# Altium footprint library Hydrolib_pcb.PcbLib: 101 footprints (part 1 of 7)
Each footprint in its own frame and in the unit in brackets; x right, y up, seen from the top. Pads: shape width x height; smd on the part's side, far side on the other; paste and mask are expansions set on the pad; w line width, h text height; cw(c..) or ccw(c..) is an arc to the next point about the centre after c.
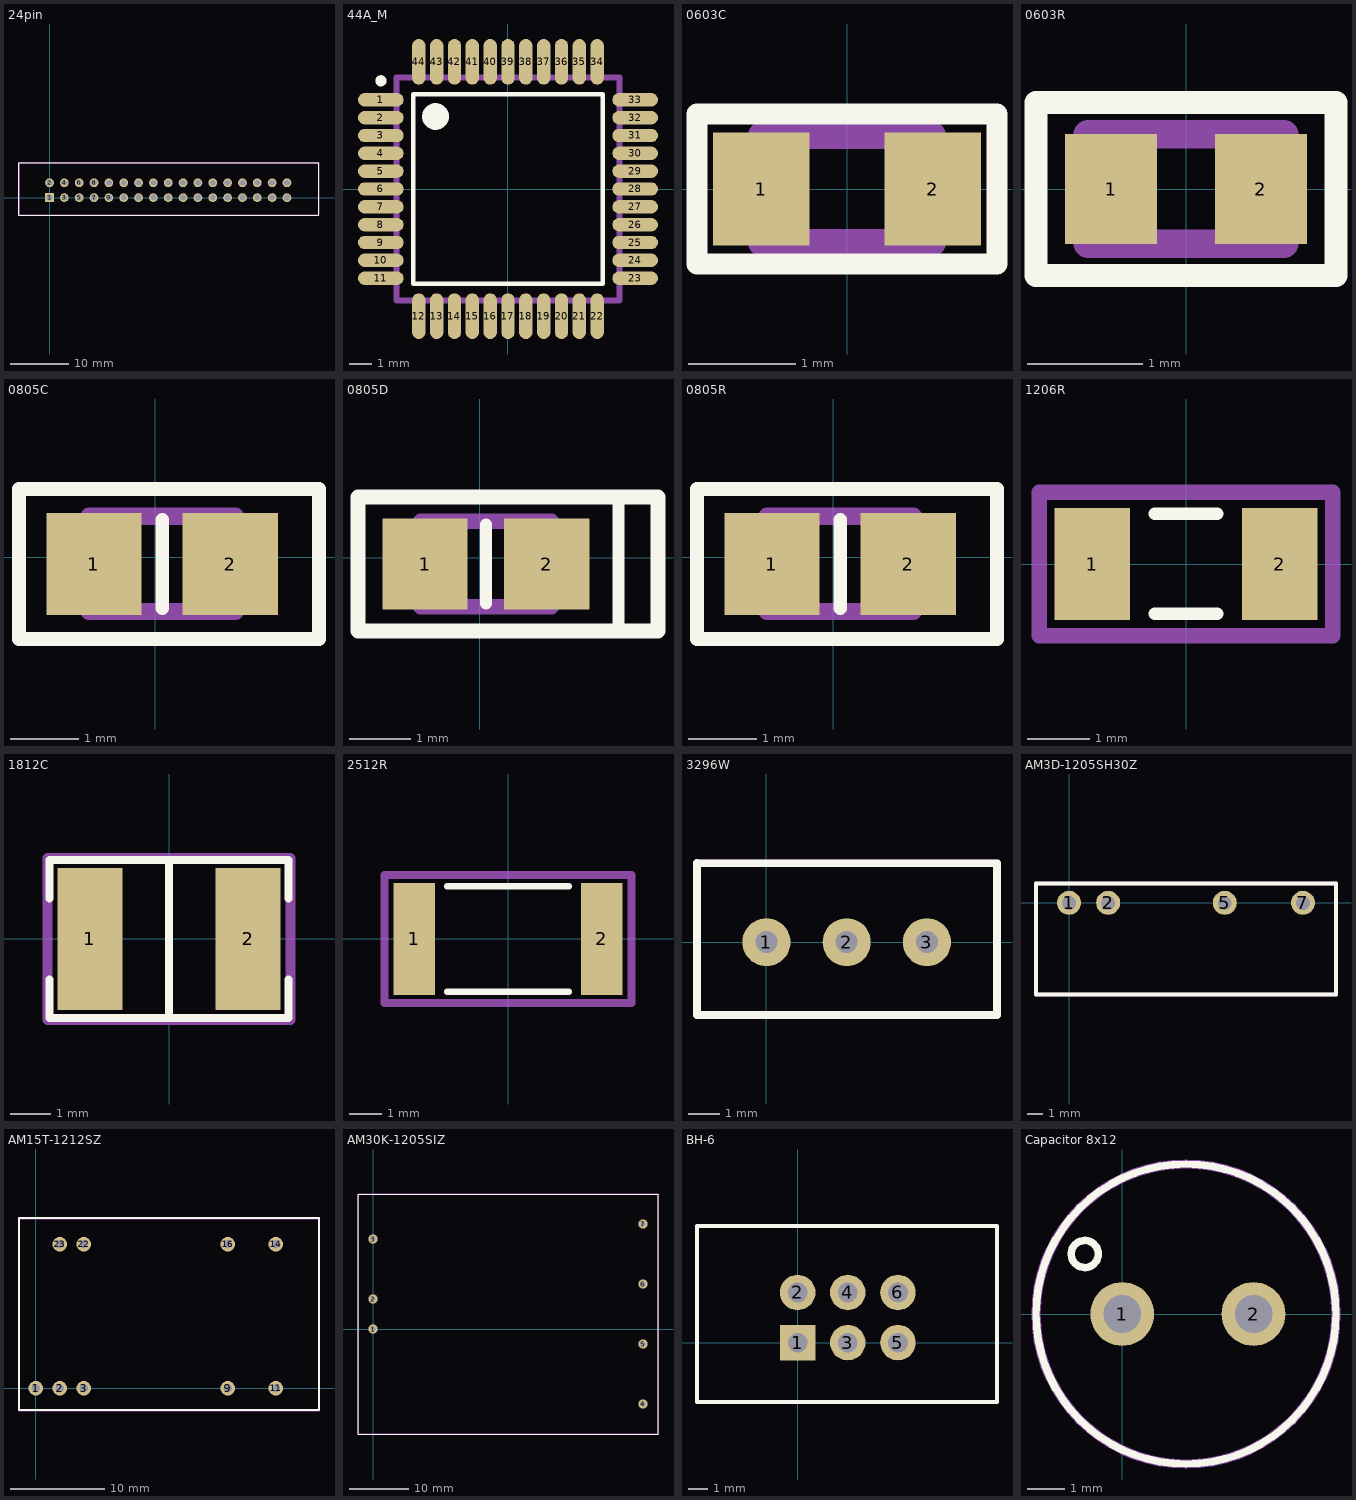
[diagram p0: the footprints below, top view; thin cyan lines are the x and y axes]

## 24pin [mm]
pads (34):
  rect 1.5x1.5 hole 1: 1(0,0)
  round 1.5 hole 1: 2(0,2.54) 3(2.54,0) 4(2.54,2.54) 5(5.08,0) 6(5.08,2.54) 7(7.62,0) 8(7.62,2.54) 9(10.16,0) 10(10.16,2.54) 11(12.7,0) 12(12.7,2.54) 13(15.24,0) 14(15.24,2.54) 15(17.78,0) 16(17.78,2.54) 17(20.32,0) 18(20.32,2.54) 19(22.86,0) 20(22.86,2.54) 21(25.4,0) 22(25.4,2.54) 23(27.94,0) 24(27.94,2.54) 25(30.48,0) 26(30.48,2.54) 27(33.02,0) 28(33.02,2.54) 29(35.56,0) 30(35.56,2.54) 31(38.1,0) 32(38.1,2.54) 33(40.64,0) 34(40.64,2.54)
Top Overlay:
  lines w0.2: -5.201,6 -5.224,5.977 -5.224,-3.017 46.076,-3.017 46.11,-2.982 46.11,6 46.109,6.001 -5.2,6.001
Bottom Overlay:
  lines w0.2: -5.214,-2.989 -5.2,-2.975 ; -5.2,6 -5.2,6.001 46.052,6.001 46.126,5.926 46.126,-3.004 -5.171,-3.004
  lines w0.254: -5.2,-2.975 -5.2,6.001
Pattern top:
  lines w0.25: -5.224,6 -5.224,-3.017 46.076,-3.017 ; -5.108,6.001 46.05,6.001 ; 46.11,-3.047 46.11,6
  lines w0.254: -5.2,-3 -5.2,-0.5
  text ".Designator" at 15.1,3.2 h2.15
3D body "BH-34.STEP": height 9, standoff -3.1, extent -5.044,-3.154 45.736,5.846

## 44A_M [mm] "Thin QFP, 44-Leads, Body 10x10mm, Pitch 0.8mm, IPC Low Density"
height 1.2
pads (44):
  oval 2.05x0.6 smd: 1(-5.7,4) 2(-5.7,3.2) 3(-5.7,2.4) 4(-5.7,1.6) 5(-5.7,0.8) 6(-5.7,0) 7(-5.7,-0.8) 8(-5.7,-1.6) 9(-5.7,-2.4) 10(-5.7,-3.2) 11(-5.7,-4) 23(5.7,-4) 24(5.7,-3.2) 25(5.7,-2.4) 26(5.7,-1.6) 27(5.7,-0.8) 28(5.7,0) 29(5.7,0.8) 30(5.7,1.6) 31(5.7,2.4) 32(5.7,3.2) 33(5.7,4)
  oval 0.6x2.05 smd: 12(-4,-5.7) 13(-3.2,-5.7) 14(-2.4,-5.7) 15(-1.6,-5.7) 16(-0.8,-5.7) 17(0,-5.7) 18(0.8,-5.7) 19(1.6,-5.7) 20(2.4,-5.7) 21(3.2,-5.7) 22(4,-5.7) 34(4,5.7) 35(3.2,5.7) 36(2.4,5.7) 37(1.6,5.7) 38(0.8,5.7) 39(0,5.7) 40(-0.8,5.7) 41(-1.6,5.7) 42(-2.4,5.7) 43(-3.2,5.7) 44(-4,5.7)
Top Overlay:
  circle w0.6: c-3.25,3.25 r0.3
  circle w0.25: c-5.7,4.85 r0.125
  lines w0.2: -4.25,-4.25 4.25,-4.25 4.25,4.25 -4.25,4.25 -4.25,-4.25
Pattern top:
  lines w0.25: -5,-5 5,-5 5,5 -5,5 -5,-5
  text ".Designator" at -4,0 h2.15
3D body: height 1.2, standoff 0, extent -5,-5 5,5

## 0603C [mm] "Chip Resistor, 2-Leads, Body 1,40x0,80mm, IPC Medium Density"
height 0.9
pads (2):
  rect 0.9x1.05 smd: 1(-0.8,0) 2(0.8,0)
Top Overlay:
  lines w0.2: -1.4,-0.7 1.4,-0.7 1.4,0.7 -1.4,0.7 -1.4,-0.7
Pattern top:
  lines w0.25: -0.8,-0.5 0.8,-0.5 0.8,0.5 -0.8,0.5 -0.8,-0.5
  text ".Designator" at -2.2,1.4 h2.15
3D body "CAPC-0603-T0.9-BN.stp": height 0.9, standoff 0, extent -0.85,-0.45 0.85,0.45

## 0603R [mm] "Chip Resistor, 2-Leads, Body 1.60x0.85mm, IPC Medium Density"
height 0.5
pads (2):
  rect 0.8x0.95 smd: 1(-0.65,0) 2(0.65,0)
Top Overlay:
  lines w0.2: -1.3,-0.75 1.3,-0.75 1.3,0.75 -1.3,0.75 -1.3,-0.75
Pattern top:
  lines w0.25: -0.85,-0.475 0.85,-0.475 0.85,0.475 -0.85,0.475 -0.85,-0.475
  text ".Designator" at -2.4,1.4 h2.15
3D body "NTC-0603-T0.9.stp": height 0.9, standoff 0, extent -0.875,-0.475 0.875,0.475

## 0805C [mm]
pads (2):
  rect 1.4x1.5 smd: 1(-0.9,-0.1) 2(1.1,-0.1)
Top Overlay:
  lines w0.2: 0.1,-0.75 0.1,0.55 ; -2,-1.2 -2,1 2.4,1 2.4,-1.2 -2,-1.2
Pattern top:
  lines w0.25: -0.975,-0.8 1.175,-0.8 1.175,0.6 -0.975,0.6 -0.975,-0.8
  text ".Designator" at -3.4,1.6 h2.15
3D body "CAPC-0805-T1.35-BN.stp": height 0.67, standoff -0.67, extent -0.95,-0.8 1.15,0.55

## 0805D [mm]
pads (2):
  rect 1.4x1.5 smd: 1(-0.9,-0.1) 2(1.1,-0.1)
Top Overlay:
  lines w0.2: 0.1,-0.75 0.1,0.55 ; 2.275,1 2.275,-1.15 2.325,-1.2 2.925,-1.2
  lines w0.254: -2,-1.2 -2,1 2.925,1 2.925,-1.2 -2,-1.2
Pattern top:
  lines w0.25: -0.975,-0.8 1.175,-0.8 1.175,0.6 -0.975,0.6 -0.975,-0.8
3D body "Surface Mount Chip LED 3.2x1.6mm 2.STEP": height 1.11, standoff 0, extent -1.5,-0.903 1.7,0.697

## 0805R [mm]
pads (2):
  rect 1.4x1.5 smd: 1(-0.9,-0.1) 2(1.1,-0.1)
Top Overlay:
  lines w0.2: 0.1,-0.75 0.1,0.55 ; -2,-1.2 -2,1 2.4,1 2.4,-1.2 -2,-1.2
Pattern top:
  lines w0.25: -0.975,-0.8 1.175,-0.8 1.175,0.6 -0.975,0.6 -0.975,-0.8
  text ".Designator" at -1.4,1.8 h2.15
3D body "User Library-Chip Resistor2.step": height 0.5, standoff 0, extent -0.9,-0.7 1.1,0.5

## 1206R [mm]
pads (2):
  rect 1.2x1.8 smd: 1(-1.5,0) 2(1.5,0)
Top Overlay:
  lines w0.2: -0.5,-0.8 0.5,-0.8 ; -0.5,0.8 0.5,0.8
Pattern top:
  lines w0.25: -2.35,-1.15 2.35,-1.15 2.35,1.15 -2.35,1.15 -2.35,-1.15
  text ".Designator" at -3.2,-0.5 h2.15
3D body "RES1206.stp": height 0.55, standoff 0, extent -1.55,-0.772 1.55,0.78

## 1812С [mm]
pads (2):
  rect 1.6x3.5 smd: 1(-1.95,0) 2(1.95,0)
Top Overlay:
  lines w0.2: -2.95,-1 -2.95,-1.95 2.95,-1.95 2.95,-1 ; -2.95,1 -2.95,1.95 2.95,1.95 2.95,1 ; 0,-1.95 0,1.95
Pattern top:
  lines w0.25: -3,-2 3,-2 3,2 -3,2 -3,-2
  text ".Designator" at -4.1,-0.3 h2.15
3D body "CAP 1812-1.75mm.STEP": height 1.75, standoff 0, extent -2.25,-1.6 2.25,1.6

## 2512R [mm] "Chip Resistor, 2-Leads, Body 6,35x3,20mm, IPC Medium Density"
height 0.6
pads (2):
  rect 1.3x3.5 smd: 1(-2.925,0) 2(2.925,0)
Top Overlay:
  lines w0.2: -1.9,-1.65 1.9,-1.65 ; -1.9,1.65 1.9,1.65
Pattern top:
  lines w0.25: -3.85,-2 3.85,-2 3.85,2 -3.85,2 -3.85,-2
  text ".Designator" at -4.075,3.125 h2.15
Mechanical 13:
  lines w0.1: -3.225,-1.55 -3.225,1.55 ; 3.225,-1.55 3.225,1.55
3D body: height 0.6, standoff 0, extent 2.625,-1.55 3.225,1.55
3D body: height 0.6, standoff 0, extent -3.225,-1.55 -2.625,1.55
3D body: height 0.6, standoff 0, extent -2.625,-1.55 2.625,1.55

## 3296W [mil]
pads (3):
  round 60 hole 27.56: 1(0,0) 2(100,0) 3(200,0)
Top Overlay:
  lines w9.84: -86.61,98.43 287.4,98.43 287.4,-90.55
  lines w10: -86.61,98.43 -86.61,-90.55 287.4,-90.55
Pattern top:
  lines w9.84: -86.61,98.43 287.4,98.43 287.4,-90.55
  lines w10: -86.61,98.43 -86.61,-90.55 287.4,-90.55
  text ".Designator" at -55.12,106.3 h84.65
3D body "w.STEP": height 453.7, standoff -253.3, extent -89.07,-94.49 285.92,95.51

## AM3D-1205SH30Z [mm]
height 9.5
pads (4):
  round 1.56 hole 0.9: 1(0,0) 2(2.54,0) 5(10.12,0) 7(15.2,0)
Top Overlay:
  lines w0.254: -2.15,-5.95 17.35,-5.95 17.35,1.25 -2.15,1.25 -2.15,-5.95
Pattern top:
  lines w0.254: -2.15,-5.95 -2.15,1.25 17.35,1.25 17.35,-5.95 -2.15,-5.95
  text ".Designator" at 3.8,-3.1 h2.15
3D body "DC-DC.STEP": height 10.5, standoff -2.55, extent -2.15,-5.9 17.35,1.3

## AM15T-1212SZ [mm]
pads (9):
  round 1.56 hole 0.9: 1(0,0) 2(2.54,0) 3(5.08,0) 9(20.32,0) 11(25.4,0) 14(25.4,15.24) 16(20.32,15.24) 22(5.08,15.24) 23(2.54,15.24)
Top Overlay:
  lines w0.2: 2.54,18.034 -1.778,18.034 ; -1.778,18.034 -1.778,-2.286 29.972,-2.286 29.972,18.034 -1.778,18.034
Pattern top:
  lines w0.25: 2.54,18 -1.778,18 ; -1.778,18 29.972,18 29.972,-2.32 -1.778,-2.32 -1.778,18
  text ".Designator" at 9.3,8.1 h2.15
3D body "AM15T-1212SZ(DC-DC преобр).STEP": height 11.16, standoff -2.05, extent -1.905,-2.54 29.845,17.78

## AM30K-1205SIZ [mm]
pads (7):
  round 1.56 hole 0.9: 1(0,0) 2(0,5.08) 3(0,15.24) 4(45.72,-12.7) 5(45.72,-2.54) 6(45.72,7.62) 7(45.72,17.78)
Top Overlay:
  lines w0.2: 48.26,17.78 48.26,22.86 ; 48.26,22.86 48.26,-17.78 -2.54,-17.78 -2.54,22.86 48.26,22.86
Pattern top:
  lines w0.25: 48.26,17.78 48.26,22.86 ; 48.26,22.86 -2.54,22.86 -2.54,-17.78 48.26,-17.78 48.26,22.86
  text ".Designator" at 14.3,2.1 h2.15
3D body "AM30K-1205SIZ(DC-DC перобр).STEP": height 10.16, standoff -5.59, extent -2.54,-17.78 48.26,22.86

## BH-6 [mm]
pads (6):
  rect 1.8x1.8 hole 1: 1(0,0)
  round 1.8 hole 1: 2(0,2.54) 3(2.54,0) 4(2.54,2.54) 5(5.08,0) 6(5.08,2.54)
Top Overlay:
  lines w0.2: -5.1,-3 -5.1,5.9 10.1,5.9 10.1,-3 -5.1,-3
Template:
  lines w0.1: -5.07,-2.98 10.1,-2.98 10.1,5.87 -5.07,5.87 -5.07,-2.98
Mechanical 15:
  lines w0.1: -5.1,-3 -5.1,5.9 10.1,5.9 10.1,-3 -5.1,-3

## Capacitor 8x12 [mm]
pads (2):
  round 1.7 hole 1: 1(0,0) 2(3.5,0)
Top Overlay:
  circle w0.2: c-1,1.6 r0.361
  circle w0.2: c1.7,0 r4
Pattern top:
  circle w0.25: c1.7,0 r4
  text ".Designator" at -2.1,-0.4 h2.15
3D body "Kondensator_8kh12.step": height 12.5, standoff -18.5, extent -2.3,-4.1 5.7,3.9